# Altium schematic symbol library BARKO_SCHLIB.SchLib: 1064 symbols (part 2 of 11) (continued)
## CON-2X2-4.2MM-V (continued)
CONN HEADER VERT 4POS 4.2MM; Manufacturer: Molex; Max Voltage Rating (DC): 600.6kV; Voltage Rating: 600V; Current Rating: 9A; Mating Cycles: 30; Gender: Male; Contact Resistance: 10mR; Max Current Rating: 8A; Number of Positions: 4; Connector Type: Rectangular; Insulation Resistance: 1GR; Row Spacing: 5.5mm; Approvals: UL,CSA,TUV; Glow Wire Compliant: Non-compliant; Washability: OK; .Creator: M.OZKAN; .PCBCHK: USED; Supplier 1: Digi-Key; Manufacturer Part Number: 39-28-8040; Stock 1: 2184; Pricing 1: 1=1,05000, 10=0,92000, 100=0,79330, 500=0,64908, 1000=0,57696, 5000=0,50484, 10000=0,47960 (USD); RoHS: Yes; Mount: Through Hole; Contact Plating: Tin,Copper,Bright; Contact Material: Brass; Color: Natural; Material: Nylon; Housing Color: Natural; Housing Material: Nylon; Min Operating Temperature: -40°C; Max Operating Temperature: 105°C; Number of Rows: 2; Voltage Rating (AC): 600V; Contact Gender: Male; Packaging: Bulk; Package Quantity: 700; Termination: Solder; Number of Contacts: 4; Max Voltage Rating (AC): 600V; Orientation: Straight; Number of Circuits: 4; Voltage Rating (DC): 600V; Length: 10mm; Height: 12.8mm; Lead Pitch: 4.2mm; Width: 12.8mm; Pitch: 4.2mm; Depth: 11mm; Radiation Hardening: No; REACH SVHC: Unknown; Halogen Free: Low Halogen; Lead Free: Lead Free; Flammability Rating: UL94 V-0; ComponentLink1URL: https://datasheet.ciiva.com/7843/1596928-7843938.pdf?src-supplier=Element14; ComponentLink1Description: https://datasheet.ciiva.com/7843/1596928-7843938.pdf?src-supplier=Element14; ComponentLink2URL: https://datasheet.ciiva.com/22683/1722365-22683427.pdf?src-supplier=Element14; ComponentLink2Description: https://datasheet.ciiva.com/22683/1722365-22683427.pdf?src-supplier=Element14; ComponentLink3URL: https://datasheet.ciiva.com/16654/0039288040-pcb-headers-16654999.pdf?src-supplier=Avnet+Europe; ComponentLink3Description: https://datasheet.ciiva.com/16654/0039288040-pcb-headers-16654999.pdf?src-supplier=Avnet+Europe; ComponentLink4URL: https://datasheet.ciiva.com/5147/0039288040-pcb-headers-228424-5147723.pdf?src-supplier=Mouser; ComponentLink4Description: https://datasheet.ciiva.com/5147/0039288040-pcb-headers-228424-5147723.pdf?src-supplier=Mouser; ComponentLink5URL: https://datasheet.ciiva.com/11746/0900766b80d882e8-11746219.pdf?src-supplier=RSComponents; ComponentLink5Description: https://datasheet.ciiva.com/11746/0900766b80d882e8-11746219.pdf?src-supplier=RSComponents; ComponentLink6URL: https://datasheet.ciiva.com/30131/73420039288040-pcb-headers-30131996.pdf?src-supplier=Onlinecomponents.com; ComponentLink6Description: https://datasheet.ciiva.com/30131/73420039288040-pcb-headers-30131996.pdf?src-supplier=Onlinecomponents.com; ComponentLink7URL: https://datasheet.ciiva.com/19461/881346-19461679.pdf?src-supplier=Jameco; ComponentLink7Description: https://datasheet.ciiva.com/19461/881346-19461679.pdf?src-supplier=Jameco; ComponentLink8URL: https://datasheet.ciiva.com/26916/getdatasheetpartid-149656-26916395.pdf?src-supplier=Verical; ComponentLink8Description: https://datasheet.ciiva.com/26916/getdatasheetpartid-149656-26916395.pdf?src-supplier=Verical; Supplier Part Number 1: WM23801-ND; .SCHCHK: USED
pins: 1, 2, 3, 4

## CON-2X3-PROGRAMLAYICI
designator J?  (value not drawn)
.PCBCHK: USED; .Creator: F:TALI; Washability: OK; .SCHCHK: USED
footprint P-TC2030-IDC
pins: 1, 2, 3, 4, 5, 6

## CON-2X3X1.27-PROGRAMLAYICI
designator J?  (value not drawn)
CONN HEADER SMD 6POS 1.27MM; Manufacturer Part Number: FTSH-103-01-L-DV; .PCBCHK: USED; .Creator: M.OZKAN; Washability: OK; .SCHCHK: USED
footprint P-2X3X1.27-HEADER
pins: 1, 2, 3, 4, 5, 6

## CON-2X5-4.2MM
designator J?, comment L-KLS1-4.20-2X05-S
CONN HEADER VERT 10POS 4.2MM; Manufacturer: Molex; Gender: Male; Current Rating: 7A; Number of Poles: 10; Voltage Rating (AC): 600V; Max Current Rating: 3A; Max Voltage Rating (DC): 600.6kV; Connector Type: Power,Rectangular; Working Voltage: 250V; Insulation Resistance: 1GR; Approvals: UL,CSA,TUV; Glow Wire Compliant: Non-compliant; Washability: OK; .Creator: M.OZKAN; .PCBCHK: USED; Supplier 1: Digi-Key; Manufacturer Part Number: 39-28-1103; Stock 1: 2431; Pricing 1: 1=1,39000, 10=1,26000, 100=1,07960, 500=0,89968, 1000=0,77115, 5000=0,68375, 10000=0,66833 (USD); RoHS: Yes; Mount: Through Hole; Contact Plating: Tin,Gold; Contact Material: Brass,Bronze; Color: Natural,Clear; Housing Color: Black; Housing Material: Nylon; Min Operating Temperature: -65°C; Max Operating Temperature: 105°C; Packaging: Bulk; Number of Rows: 2; Voltage Rating: 600V; Package Quantity: 250; Contact Gender: Male; Number of Positions: 10; Termination: Solder; Number of Contacts: 10; Orientation: Straight; Voltage Rating (DC): 600V; Number of Circuits: 10; Length: 101.19mm; Height: 3.5mm; Lead Pitch: 4.2mm; Pitch: 4.2mm; Row Spacing: 4.2mm; Depth: 9.39mm; Radiation Hardening: No; Halogen Free: Low Halogen; Lead Free: Lead Free; Flammability Rating: UL94 V-2; ComponentLink1URL: https://datasheet.ciiva.com/19462/1968785-19462082.pdf?src-supplier=Jameco; ComponentLink1Description: https://datasheet.ciiva.com/19462/1968785-19462082.pdf?src-supplier=Jameco; ComponentLink2URL: https://datasheet.ciiva.com/5150/0039281103-pcb-headers-159999-5150355.pdf?src-supplier=Mouser; ComponentLink2Description: https://datasheet.ciiva.com/5150/0039281103-pcb-headers-159999-5150355.pdf?src-supplier=Mouser; ComponentLink3URL: https://datasheet.ciiva.com/20209/22-3810e-20209539.pdf?src-supplier=Rapid+Electronics; ComponentLink3Description: https://datasheet.ciiva.com/20209/22-3810e-20209539.pdf?src-supplier=Rapid+Electronics; ComponentLink4URL: https://datasheet.ciiva.com/11746/0900766b80460da7-11746923.pdf?src-supplier=RSComponents; ComponentLink4Description: https://datasheet.ciiva.com/11746/0900766b80460da7-11746923.pdf?src-supplier=RSComponents; ComponentLink5URL: https://datasheet.ciiva.com/1442/1786428-1442785.pdf?src-supplier=Element14; ComponentLink5Description: https://datasheet.ciiva.com/1442/1786428-1442785.pdf?src-supplier=Element14; ComponentLink6URL: https://datasheet.ciiva.com/18453/70190699-18453847.pdf?src-supplier=Allied+Electronics; ComponentLink6Description: https://datasheet.ciiva.com/18453/70190699-18453847.pdf?src-supplier=Allied+Electronics; Supplier Part Number 1: WM3804-ND; .SCHCHK: USED
footprint CON-2X5-4.2MM-TH
pins: 1, 2, 3, 4, 5, 6, 7, 8, 9, 10

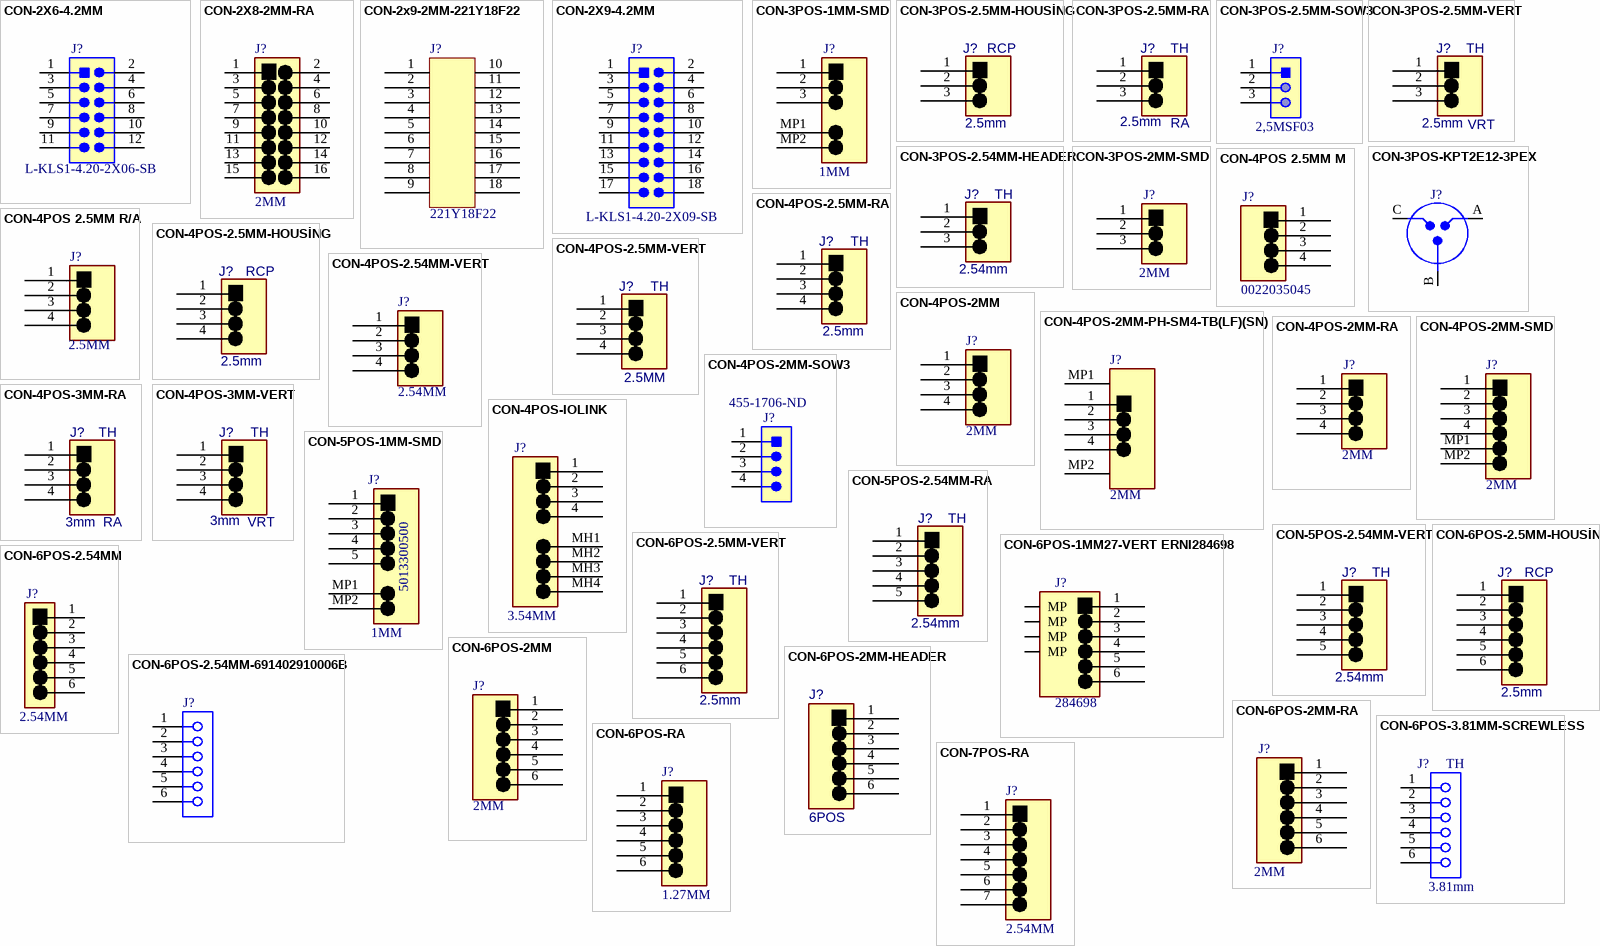
[diagram p5: symbols CON-2X6-4.2MM to CON-7POS-RA]

## CON-2X6-4.2MM
designator J?, comment L-KLS1-4.20-2X06-SB
CONN HEADER VERT 12POS 4.2MM; Manufacturer: Molex; Current Rating: 9A; Voltage Rating: 600V; Max Voltage Rating (DC): 600.6kV; Contact Resistance: 10mR; Max Current Rating: 6A; Number of Positions: 12; Gender: Female; Contact Post Length: 3.5mm; Glow Wire Compliant: Non-compliant; Washability: OK; .Creator: M.OZKAN; .PCBCHK: USED; Supplier 1: Digi-Key; Manufacturer Part Number: 39-29-3126; Stock 1: 1794; Pricing 1: 1=1,74000, 10=1,57700, 100=1,35140, 500=1,12612, 1000=0,96525, 5000=0,85586, 10000=0,83655 (USD); RoHS: Yes; Mount: Through Hole; Contact Material: Brass; Contact Plating: Tin,Copper; Housing Color: Natural; Color: Natural; Housing Material: Nylon; Min Operating Temperature: -40°C; Max Operating Temperature: 105°C; Package Quantity: 225; Number of Rows: 2; Packaging: Bulk; Contact Gender: Male; Termination: Solder; Number of Contacts: 12; Orientation: Straight; Number of Circuits: 12; Height: 12.8mm; Pitch: 4.2mm; Row Spacing: 4.2mm; Radiation Hardening: No; Halogen Free: Low Halogen; ComponentLink1URL: https://datasheet.ciiva.com/30119/70260039293126-pcb-headers-30119121.pdf?src-supplier=Onlinecomponents.com; ComponentLink1Description: https://datasheet.ciiva.com/30119/70260039293126-pcb-headers-30119121.pdf?src-supplier=Onlinecomponents.com; ComponentLink2URL: https://datasheet.ciiva.com/16654/0039293126-pcb-headers-16654565.pdf?src-supplier=Avnet+Europe; ComponentLink2Description: https://datasheet.ciiva.com/16654/0039293126-pcb-headers-16654565.pdf?src-supplier=Avnet+Europe; ComponentLink3URL: https://datasheet.ciiva.com/5150/0039293126-pcb-headers-140105-5150183.pdf?src-supplier=Mouser; ComponentLink3Description: https://datasheet.ciiva.com/5150/0039293126-pcb-headers-140105-5150183.pdf?src-supplier=Mouser; ComponentLink4URL: https://datasheet.ciiva.com/19461/1299462-19461278.pdf?src-supplier=Jameco; ComponentLink4Description: https://datasheet.ciiva.com/19461/1299462-19461278.pdf?src-supplier=Jameco; ComponentLink5URL: https://datasheet.ciiva.com/1403/1596536-1403542.pdf?src-supplier=Element14; ComponentLink5Description: https://datasheet.ciiva.com/1403/1596536-1403542.pdf?src-supplier=Element14; Supplier Part Number 1: WM3848-ND; .SCHCHK: USED
footprint CON-2X6-4.2MM-TH
pins: 1, 2, 3, 4, 5, 6, 7, 8, 9, 10, 11, 12

## CON-2X8-2MM-RA
designator J?, comment 2MM
CONN HEADER 2X8 POS 2MM R/A; Washability: OK; .Creator: M.OZKAN; .PCBCHK: USED; .SCHCHK: USED
footprint CON-2X8-2MM-RA
pins: 1, 2, 3, 4, 5, 6, 7, 8, 9, 10, 11, 12, 13, 14, 15, 16

## CON-2x9-2MM-221Y18F22
designator J?, comment 221Y18F22
CONN MALE 2X9 POS 2MM PCB Straight.; Manufacturer: nicomatic; .Creator: HKARA; Washability: OK; .PCBCHK: *; .SCHCHK: *; Manufacturer Part Number: 221Y18F22
footprint CON-16POS-2MM-221Y18F22 (Nicomatic 221Y18F22)
pins: 1, 2, 3, 4, 5, 6, 7, 8, 9, 10, 11, 12, 13, 14, 15, 16, 17, 18

## CON-2X9-4.2MM
designator J?, comment L-KLS1-4.20-2X09-SB
CONN HEADER VERT 18POS 4.2MM; Manufacturer: Molex; Contact Resistance: 10mR; Number of Positions: 18; Number of Ports: 1; Max Voltage Rating (AC): 600V; Gender: Male; Connector Type: Male Pin; Row Spacing: 0.165inch; Washability: OK; .Creator: M.OZKAN; .PCBCHK: USED; Supplier 1: Digi-Key; Manufacturer Part Number: 39-28-1183; Stock 1: 102; Pricing 1: 1=2,61000, 10=2,50400, 100=2,08680, 500=1,77378, 1000=1,51293, 5000=1,35642 (USD); RoHS: Yes; Mount: Through Hole; Contact Material: Brass; Contact Plating: Tin,Copper,Bright; Color: Natural; Number of Terminals: 18; Housing Color: Natural; Housing Material: Nylon; Min Operating Temperature: -40°C; Max Operating Temperature: 105°C; Packaging: Tray; Number of Rows: 2; Fastening Type: Ramp; Termination: Solder; Number of Contacts: 18; Max Voltage Rating (DC): 600V; Orientation: Straight; Length: 39.8mm; Pitch: 4.2mm; Depth: 11mm; ComponentLink1URL: https://datasheet.ciiva.com/11748/0900766b80c67620-11748530.pdf?src-supplier=RSComponents; ComponentLink1Description: https://datasheet.ciiva.com/11748/0900766b80c67620-11748530.pdf?src-supplier=RSComponents; ComponentLink2URL: https://datasheet.ciiva.com/30232/3980039281183-pcb-headers-30232211.pdf?src-supplier=Onlinecomponents.com; ComponentLink2Description: https://datasheet.ciiva.com/30232/3980039281183-pcb-headers-30232211.pdf?src-supplier=Onlinecomponents.com; ComponentLink3URL: https://datasheet.ciiva.com/26916/getdatasheetpartid-292510-26916571.pdf?src-supplier=Verical; ComponentLink3Description: https://datasheet.ciiva.com/26916/getdatasheetpartid-292510-26916571.pdf?src-supplier=Verical; ComponentLink4URL: https://datasheet.ciiva.com/27055/1968822-27055405.pdf?src-supplier=Jameco; ComponentLink4Description: https://datasheet.ciiva.com/27055/1968822-27055405.pdf?src-supplier=Jameco; ComponentLink5URL: https://datasheet.ciiva.com/18486/039281183-sd-18486411.pdf?src-supplier=Digi-Key; ComponentLink5Description: https://datasheet.ciiva.com/18486/039281183-sd-18486411.pdf?src-supplier=Digi-Key; ComponentLink6URL: https://datasheet.ciiva.com/49273/303925-49273802.pdf?src-supplier=Jameco; ComponentLink6Description: https://datasheet.ciiva.com/49273/303925-49273802.pdf?src-supplier=Jameco; Supplier Part Number 1: WM3808-ND; .SCHCHK: USED
footprint CON-2X9-4.2MM-TH
pins: 1, 2, 3, 4, 5, 6, 7, 8, 9, 10, 11, 12, 13, 14, 15, 16, 17, 18

## CON-3POS-1MM-SMD
designator J?, comment 1MM
CONN HEADER 1MM 3POS SMD TIN; Manufacturer: Molex; Manufacturer Part Number: 501331-0307; Number of Contacts: 3; Voltage Rating: 50V; Current Rating: 1A; Gender: Male; Connector Type: Male Pin; Contact Resistance: 20mR; Max Voltage Rating (DC): 5.05kV; Glow Wire Compliant: Non-compliant; Washability: OK; .Creator: M.OZKAN; .PCBCHK: USED; Supplier 1: Digi-Key; Supplier Part Number 1: WM7880CT-ND; Stock 1: 4520; Pricing 1: 1=0.62000, 10=0.58400, 100=0.44780, 500=0.38940 (USD); RoHS: Yes; Mount: Surface Mount; Contact Plating: Tin; Contact Material: Bronze,Tin; Color: Natural; Housing Color: Natural; Housing Material: Nylon; Min Operating Temperature: -40°C; Max Operating Temperature: 85°C; Number of Rows: 1; Termination: Solder; Packaging: Tape and Reel; Fastening Type: Detent; Number of Positions: 3; Max Voltage Rating (AC): 50V; Orientation: Vertical; Package Quantity: 1; Contact Gender: Male; Number of Circuits: 3; Length: 5.24mm; Pitch: 1mm; Depth: 3.5mm; Radiation Hardening: No; REACH SVHC: Unknown; Lead Free: Lead Free; ComponentLink1URL: https://datasheet.ciiva.com/724/5013310207-sd-724391.pdf?src-supplier=Digi-Key; ComponentLink1Description: https://datasheet.ciiva.com/724/5013310207-sd-724391.pdf?src-supplier=Digi-Key; ComponentLink2URL: https://datasheet.ciiva.com/5155/5013310307-pcb-headers-179250-5155744.pdf?src-supplier=Mouser; ComponentLink2Description: https://datasheet.ciiva.com/5155/5013310307-pcb-headers-179250-5155744.pdf?src-supplier=Mouser; ComponentLink3URL: https://datasheet.ciiva.com/9469/5013310307-pcb-headers-9469056.pdf?src-supplier=Avnet; ComponentLink3Description: https://datasheet.ciiva.com/9469/5013310307-pcb-headers-9469056.pdf?src-supplier=Avnet; ComponentLink4URL: https://datasheet.ciiva.com/30175/3755013310307-pcb-headers-30175520.pdf?src-supplier=Onlinecomponents.com; ComponentLink4Description: https://datasheet.ciiva.com/30175/3755013310307-pcb-headers-30175520.pdf?src-supplier=Onlinecomponents.com; ComponentLink5URL: https://datasheet.ciiva.com/14804/263235013310307-pcb-headers-14804423.pdf?src-supplier=Arrow; ComponentLink5Description: https://datasheet.ciiva.com/14804/263235013310307-pcb-headers-14804423.pdf?src-supplier=Arrow; ComponentLink6URL: https://datasheet.ciiva.com/11750/0900766b80b0af91-11750733.pdf?src-supplier=RSComponents; ComponentLink6Description: https://datasheet.ciiva.com/11750/0900766b80b0af91-11750733.pdf?src-supplier=RSComponents; ComponentLink7URL: https://datasheet.ciiva.com/16656/5013310307-pcb-headers-16656427.pdf?src-supplier=Avnet+Europe; ComponentLink7Description: https://datasheet.ciiva.com/16656/5013310307-pcb-headers-16656427.pdf?src-supplier=Avnet+Europe; ComponentLink8URL: https://datasheet.ciiva.com/724/5013310307-sd-724428.pdf?src-supplier=Digi-Key; ComponentLink8Description: https://datasheet.ciiva.com/724/5013310307-sd-724428.pdf?src-supplier=Digi-Key; ComponentLink9URL: https://datasheet.ciiva.com/9469/5013310307-pcb-headers-9469053.pdf?src-supplier=Avnet; ComponentLink9Description: https://datasheet.ciiva.com/9469/5013310307-pcb-headers-9469053.pdf?src-supplier=Avnet; ComponentLink10URL: https://datasheet.ciiva.com/727/5013310307-sd-727119.pdf?src-supplier=Digi-Key; ComponentLink10Description: https://datasheet.ciiva.com/727/5013310307-sd-727119.pdf?src-supplier=Digi-Key; .SCHCHK: USED
footprint CON-3POS-1MM-SMD
pins: 1, 2, 3, MP1, MP2

## CON-3POS-2.5MM-HOUSİNG
designator J?  Connector Type: RCP  Pitch: 2.5mm  (hidden comment: *)
CONN HOUSING 3POS 2.5MM SHROUD; Manufacturer: Molex; Manufacturer Part Number: 0050375033; Number of Positions: 3; Gender: Female; .PCBCHK: USED; .Creator: F:TALI; Washability: OK; Supplier 1: Digi-Key; Stock 1: 10973; Pricing 1: 1=0.36, 10=0.337, 25=0.2888, 50=0.2454, 100=0.2357, 250=0.21164, 500=0.20202, 1000=0.16835, 2500=0.15392 (USD); Mount: Free Hanging; Housing Material: Nylon; Min Operating Temperature: -40°C; Max Operating Temperature: 105°C; Number of Rows: 1; Packaging: Bulk; Termination: Crimp; Number of Contacts: 3; Orientation: Straight; Fastening Type: Ramp; Length: 9.9mm; Depth: 9mm; Radiation Hardening: No; ComponentLink1URL: https://www.molex.com/pdm_docs/sd/050375033_sd.pdf; ComponentLink1Description: https://www.molex.com/pdm_docs/sd/050375033_sd.pdf; ComponentLink2URL: http://www.molex.com/webdocs/datasheets/pdf/en-us/0050375033_CRIMP_HOUSINGS.pdf; ComponentLink2Description: http://www.molex.com/webdocs/datasheets/pdf/en-us/0050375033_CRIMP_HOUSINGS.pdf; ComponentLink3URL: https://www.verical.com/server-webapp/html/getDatasheet?partID=173295; ComponentLink3Description: https://www.verical.com/server-webapp/html/getDatasheet?partID=173295; Supplier Part Number 1: WM18874-ND; .SCHCHK: USED
pins: 1 GND_IN, 2, 3

## CON-3POS-2.5MM-RA
designator J?  Mount: TH  Orientation: RA  Pitch: 2.5mm  (hidden comment: *)
CONN HEADER 3POS 2.5MM R/A TIN; Manufacturer: Molex; Manufacturer Part Number: 0022057035; Gender: Male; Contact Resistance: 20mR; Number of Positions: 3; Max Voltage Rating (DC): 250V; Connector Type: Male Pin; .PCBCHK: USED; .Creator: F:TALI; Washability: OK; Supplier 1: Digi-Key; Stock 1: 10713; Pricing 1: 1=0.56, 10=0.527, 100=0.4037, 500=0.351, 1000=0.28958, 5000=0.25448, 10000=0.23693 (USD); Colour: Natural; Contact Plating: Copper,Tin; Contact Material: Brass; Housing Colour: Natural; Housing Material: Nylon; Min Operating Temperature: -40°C; Max Operating Temperature: 105°C; Packaging: Bulk; Number of Rows: 1; Termination: Solder; Number of Contacts: 3; Max Voltage Rating (AC): 250V; Length: 9.9mm; Depth: 7.9mm; Contact Mating Length: 0.138inch; ComponentLink1URL: http://www.molex.com/webdocs/datasheets/pdf/en-us/0022057035_PCB_HEADERS.pdf; ComponentLink1Description: http://www.molex.com/webdocs/datasheets/pdf/en-us/0022057035_PCB_HEADERS.pdf; ComponentLink2URL: https://www.molex.com/pdm_docs/sd/022057035_sd.pdf; ComponentLink2Description: https://www.molex.com/pdm_docs/sd/022057035_sd.pdf; Supplier Part Number 1: WM18901-ND; .SCHCHK: USED
pins: 1 GND_IN, 2, 3

## CON-3POS-2.5MM-SOW3
designator J?, comment 2,5MSF03
Lumberg 2.5 MSF Series, 2.5mm Pitch 3 Way 1 Row Straight PCB Header, Solder Termination, 5A; Voltage Rating: 160V; Number of Contacts: 3; Gender: Male; Pitch: 5mm; Washability: OK; .Creator: M.OZKAN; .PCBCHK: USED; Supplier 1: TME; Manufacturer: Lumberg; Manufacturer Part Number: 2,5MSF03; Stock 1: 554; Pricing 1: 3=0.25440, 25=0.17800, 100=0.15820, 250=0.13850 (USD); RoHS: Yes; Case/Package: Module; Contact Material: Brass,CuZn; Contact Plating: Tin; Color: Black; Housing Material: Polyamide; Min Operating Temperature: -40°C; Max Operating Temperature: 120°C; Number of Rows: 1; Current Rating: 5A; Packaging: Bulk; Max Current Rating: 5A; Termination: Solder; Max Voltage Rating (AC): 160V; Orientation: Straight; Length: 12.2mm; Height: 22.5mm; Width: 7.5mm; Depth: 7.5mm; ComponentLink1URL: https://datasheet.ciiva.com/11754/0900766b80fbfb97-11754066.pdf?src-supplier=RSComponents; ComponentLink1Description: https://datasheet.ciiva.com/11754/0900766b80fbfb97-11754066.pdf?src-supplier=RSComponents; ComponentLink2URL: https://datasheet.ciiva.com/29195/732809-da-01-ml-stiftleiste-2-5-msf03-de-en-fr-29195855.pdf?src-supplier=Conrad; ComponentLink2Description: https://datasheet.ciiva.com/29195/732809-da-01-ml-stiftleiste-2-5-msf03-de-en-fr-29195855.pdf?src-supplier=Conrad; Supplier Part Number 1: 2.5MSF03; .SCHCHK: USED
footprint 2.5 MSF 03
pins: 1, 2, 3

## CON-3POS-2.5MM-VERT
designator J?  Orientation: VRT  Mount: TH  Pitch: 2.5mm  (hidden comment: *)
CONN HEADER 3POS 2.5MM VERT TIN; Manufacturer: Molex; Number of Contacts: 3; Gender: Male; Current Rating: 3A; Contact Resistance: 20mR; Insulation Resistance: 1GR; Voltage Rating: 250V; Shrouded: Yes (With); Test Voltage: 1kV; Glow Wire Compliant: Non-compliant; .PCBCHK: USED; .Creator: F:TALI; Washability: OK; Supplier 1: Digi-Key; Manufacturer Part Number: 22-03-5035; Stock 1: 24555; Pricing 1: 1=0.53, 10=0.497, 100=0.3811, 500=0.3314, 1000=0.27341, 5000=0.24027, 10000=0.2237 (USD); Contact Plating: Copper,Tin; Contact Material: Brass,Tin; Housing Material: Nylon; Min Operating Temperature: -40°C; Max Operating Temperature: 105°C; Number of Rows: 1; Packaging: Bulk; Termination: Solder; Number of Positions: 3; Voltage Rating (AC): 250V; Number of Poles: 3; Package Quantity: 25000; Contact Gender: Male; Working Voltage: 250V; Voltage Rating (DC): 250V; Number of Circuits: 3; Radiation Hardening: No; Lead Free: Lead Free; REACH SVHC: Unknown; Flammability Rating: UL94 V-0; ComponentLink1URL: http://uk.rs-online.com/webdocs/13c2/0900766b813c2d9b.pdf; ComponentLink1Description: http://uk.rs-online.com/webdocs/13c2/0900766b813c2d9b.pdf; ComponentLink2URL: http://www.farnell.com/datasheets/1762354.pdf; ComponentLink2Description: http://www.farnell.com/datasheets/1762354.pdf; ComponentLink3URL: http://www.mouser.com/ds/2/276/0022035035_PCB_HEADERS-158316.pdf; ComponentLink3Description: http://www.mouser.com/ds/2/276/0022035035_PCB_HEADERS-158316.pdf; Supplier Part Number 1: WM18887-ND; .SCHCHK: USED
footprint CON-3POS 2.5MM VERT
pins: 1 GND_IN, 2, 3

## CON-3POS-2.54MM-HEADER
designator J?  Pitch: 2.54mm  Mount: TH  (hidden comment: *)
CONN HEADER 3POS 2.54MM; Manufacturer: Wurth Electronics; Manufacturer Part Number: 61300311121; Number of Positions: 3; Gender: Male; Connector Type: Male Pin; .PCBCHK: USED; .Creator: F:TALI; Washability: OK; Supplier 1: Digi-Key; Stock 1: 178007; Pricing 1: 1=0.13, 10=0.106, 25=0.088, 50=0.074, 100=0.067, 1000=0.061 (USD); Contact Plating: Gold; Contact Material: Copper; Colour: Black; Number of Rows: 1; Packaging: Bulk; Termination: Solder; Number of Contacts: 3; Contact Mating Length: 0.236inch; REACH SVHC: Unknown; Lead Free: Lead Free; Supplier Part Number 1: 732-5316-ND; .SCHCHK: USED
pins: 1 GND_IN, 2, 3

## CON-3POS-2MM-SMD
designator J?, comment 2MM
CONN HEADER SMD 3POS 2MM; Manufacturer: JST; Manufacturer Part Number: B3B-PH-SM4-TB(LF)(SN); Number of Positions: 3; Connector Type: Male Pin; Contact Resistance: 20mR; Current Rating: 2A; Voltage Rating (AC): 100V; Insulation Resistance: 1GR; Gender: Male; Washability: OK; .Creator: M.OZKAN; .PCBCHK: USED; Supplier 1: Digi-Key; Supplier Part Number 1: 455-1735-2-ND; Stock 1: 36000; Pricing 1: 1000=0.29721, 2000=0.28821, 3000=0.27019, 5000=0.26118, 10000=0.24317, 25000=0.23417 (USD); RoHS: Yes; Mount: Surface Mount; Color: Natural,White; Contact Plating: Tin,Copper; Contact Material: Copper Alloy,Tin,Bronze,Brass; Housing Color: Beige; Housing Material: Polyamide; Min Operating Temperature: -25°C; Max Operating Temperature: 85°C; Number of Rows: 1; Packaging: Tape and Reel; Termination: Solder; Max Current Rating: 2A; Number of Poles: 3; Voltage Rating: 100V; Fastening Type: Detent; Max Voltage Rating (AC): 100V; Number of Contacts: 3; Max Voltage Rating (DC): 100V; Working Voltage: 100V; Orientation: Straight; Length: 9.95mm; Height: 9.4mm; Pitch: 2mm; Lead Pitch: 2mm; Width: 5.5mm; Contact Mating Length: 0.13inch; Depth: 5mm; Lead Free: Lead Free; REACH SVHC: No SVHC; Flammability Rating: UL94 V-0; ComponentLink1URL: https://datasheet.ciiva.com/11747/0900766b80ddea81-11747684.pdf?src-supplier=RSComponents; ComponentLink1Description: https://datasheet.ciiva.com/11747/0900766b80ddea81-11747684.pdf?src-supplier=RSComponents; .SCHCHK: USED
footprint CON-3POS-2MM-SMD
pins: 1 GND_IN, 2, 3

## CON-3POS-KPT2E12-3PEX
designator J?  (value not drawn)
Washability: OK; .Creator: M.OZKAN; .PCBCHK: USED; .SCHCHK: USED
footprint CON-3POS-KPT2E12-3PEX
pins: A, B, C

## CON-4POS 2.5MM M
designator J?, comment 0022035045
CONN HEADER VERT 4POS 2.5MM; Manufacturer: Molex; Number of Positions: 4; Gender: Male; Current Rating: 3A; Voltage Rating: 250V; Contact Resistance: 20mR; Insulation Resistance: 1GR; Test Voltage: 1kV; Washability: OK; .Creator: M.OZKAN; .PCBCHK: USED; Supplier 1: Digi-Key; Manufacturer Part Number: 22-03-5045; Stock 1: 28354; Pricing 1: 1=0,66000, 10=0,61400, 100=0,47100, 500=0,40960, 1000=0,33792, 5000=0,29696, 10000=0,27648 (USD); RoHS: Yes; Mount: Through Hole; Housing Material: Nylon; Contact Plating: Tin; Contact Material: Brass; Material: Nylon; Min Operating Temperature: -40°C; Max Operating Temperature: 105°C; Packaging: Bulk; Termination: Through Hole; Number of Rows: 1; Number of Contacts: 4; Package Quantity: 12000; Orientation: Straight; Contact Gender: Male; Number of Poles: 4; Voltage Rating (DC): 250V; Pitch: 2.5mm; Radiation Hardening: No; Lead Free: Lead Free; REACH SVHC: Unknown; Flammability Rating: UL94 V-0; ComponentLink1URL: https://datasheet.ciiva.com/30140/59000022035045-pcb-headers-30140706.pdf?src-supplier=Onlinecomponents.com; ComponentLink1Description: https://datasheet.ciiva.com/30140/59000022035045-pcb-headers-30140706.pdf?src-supplier=Onlinecomponents.com; ComponentLink2URL: https://datasheet.ciiva.com/11746/0900766b80da772c-11746677.pdf?src-supplier=RSComponents; ComponentLink2Description: https://datasheet.ciiva.com/11746/0900766b80da772c-11746677.pdf?src-supplier=RSComponents; ComponentLink3URL: https://datasheet.ciiva.com/5157/0022035045-pcb-headers-132183-5157848.pdf?src-supplier=Mouser; ComponentLink3Description: https://datasheet.ciiva.com/5157/0022035045-pcb-headers-132183-5157848.pdf?src-supplier=Mouser; ComponentLink4URL: https://datasheet.ciiva.com/27054/1930699-27054941.pdf?src-supplier=Jameco; ComponentLink4Description: https://datasheet.ciiva.com/27054/1930699-27054941.pdf?src-supplier=Jameco; ComponentLink5URL: https://datasheet.ciiva.com/25908/0022035045-pcb-headers-25908182.pdf?src-supplier=Avnet+Europe; ComponentLink5Description: https://datasheet.ciiva.com/25908/0022035045-pcb-headers-25908182.pdf?src-supplier=Avnet+Europe; ComponentLink6URL: https://datasheet.ciiva.com/9468/0022035045-pcb-headers-9468375.pdf?src-supplier=Avnet; ComponentLink6Description: https://datasheet.ciiva.com/9468/0022035045-pcb-headers-9468375.pdf?src-supplier=Avnet; ComponentLink7URL: https://datasheet.ciiva.com/7843/1864671-7843917.pdf?src-supplier=Element14; ComponentLink7Description: https://datasheet.ciiva.com/7843/1864671-7843917.pdf?src-supplier=Element14; Supplier Part Number 1: WM18888-ND; .SCHCHK: USED
footprint CON-22035045
pins: 1 GND_IN, 2, 3, 4

## CON-4POS 2.5MM R/A
designator J?, comment 2.5MM
CONN HEADER R/A 4POS 2.5MM; Manufacturer 1: JST; Manufacturer Part Number 1: S4B-XH-A(LF)(SN); Current Rating: 3A; Voltage Rating: 250V; Contact Resistance: 20mR; Number of Positions: 4; Insulation Resistance: 1GR; Gender: Male; Connector Type: Male Pin; Wire/Cable Gauge: 22AWG; Washability: OK; .Creator: M.OZKAN; .PCBCHK: USED; Supplier 1: Digi-Key; Stock 1: 37754; Pricing 1: 1=0,27000, 10=0,25700, 100=0,17850, 500=0,15100, 1000=0,12355, 5000=0,10982, 10000=0,09953 (USD); RoHS: Yes; Mount: Through Hole; Color: Natural; Contact Material: Brass; Contact Plating: Tin; Housing Color: White; Housing Material: Polyamide; Min Operating Temperature: -25°C; Max Operating Temperature: 85°C; Package Quantity: 500; Number of Rows: 1; Packaging: Bulk; Voltage Rating (AC): 250V; Max Current Rating: 3A; Termination: Press-Fit; Number of Contacts: 4; Max Voltage Rating (AC): 250V; Orientation: Right Angle; Length: 12.4mm; Lead Pitch: 2.5mm; Pitch: 2.5mm; Depth: 11.5mm; REACH SVHC: No SVHC; Lead Free: Lead Free; ComponentLink1URL: https://datasheet.ciiva.com/726/exh-726400.pdf?src-supplier=Digi-Key; ComponentLink1Description: https://datasheet.ciiva.com/726/exh-726400.pdf?src-supplier=Digi-Key; ComponentLink2URL: https://datasheet.ciiva.com/26924/getdatasheetpartid-449045-26924078.pdf?src-supplier=Verical; ComponentLink2Description: https://datasheet.ciiva.com/26924/getdatasheetpartid-449045-26924078.pdf?src-supplier=Verical; ComponentLink3URL: https://datasheet.ciiva.com/8052/5448-8052236.pdf?src-supplier=Element14; ComponentLink3Description: https://datasheet.ciiva.com/8052/5448-8052236.pdf?src-supplier=Element14; Supplier Part Number 1: 455-2243-ND; .SCHCHK: USED
footprint CON-4POS-2.5MM-R/A (CONN HEADER R/A 4POS 2.5MM)
pins: 1 GND_IN, 2, 3, 4

## CON-4POS-2.5MM-HOUSİNG
designator J?  Gender: RCP  Pitch: 2.5mm  (hidden comment: *)
CONN HOUSING 4POS 2.5MM SHROUD; Manufacturer: Molex; Body Material: Nylon,Polyamide; Connector Type: Power,Rectangular; Number of Positions: 4; Current Rating: 3A; Voltage Rating (AC): 250V; Shrouded: Yes (With); Test Voltage: 1kV; Insulation Resistance: 1GR; Approvals: CSA,UL; Glow Wire Compliant: Non-compliant; .PCBCHK: USED; .Creator: F:TALI; Washability: OK; Supplier 1: Digi-Key; Manufacturer Part Number: 50-37-5043; Stock 1: 6605; Pricing 1: 1=0.42, 10=0.393, 25=0.3368, 50=0.2864, 100=0.2751, 250=0.24708, 500=0.23584, 1000=0.19653, 2500=0.17968 (USD); Mount: Cable,PCB; Housing Material: Polyamide; Material: Nylon,Polyamide; Min Operating Temperature: -40°C; Max Operating Temperature: 105°C; Number of Rows: 1; Packaging: Bulk; Termination: Crimp; Number of Contacts: 4; Orientation: Straight; Number of Poles: 4; Contact Gender: Female; Package Quantity: 4000; Working Voltage: 250V; Length: 12.4mm; Height: 8mm; Depth: 8mm; Width: 3.9mm; Radiation Hardening: No; REACH SVHC: Unknown; Lead Free: Lead Free; Halogen Free: Low Halogen; Flammability Rating: UL94 V-0; ComponentLink1URL: http://www.onlinecomponents.com/productFiles/mf-MOL/377140050375043_crimp_housings.pdf; ComponentLink1Description: http://www.onlinecomponents.com/productFiles/mf-MOL/377140050375043_crimp_housings.pdf; ComponentLink2URL: http://www.molex.com/webdocs/datasheets/pdf/en-us/0050375043_CRIMP_HOUSINGS.pdf; ComponentLink2Description: http://www.molex.com/webdocs/datasheets/pdf/en-us/0050375043_CRIMP_HOUSINGS.pdf; ComponentLink3URL: http://www.farnell.com/datasheets/2035857.pdf; ComponentLink3Description: http://www.farnell.com/datasheets/2035857.pdf; ComponentLink4URL: http://www.mouser.com/ds/2/276/0050375043_CRIMP_HOUSINGS-137285.pdf; ComponentLink4Description: http://www.mouser.com/ds/2/276/0050375043_CRIMP_HOUSINGS-137285.pdf; Supplier Part Number 1: WM17405-ND; .SCHCHK: USED
pins: 1 GND_IN, 2, 3, 4

## CON-4POS-2.5MM-RA
designator J?  Pitch: 2.5mm  Mount: TH  (hidden comment: *)
CONN HEADER 4POS 2.5MM R/A TIN; Manufacturer: Molex; Number of Contacts: 4; Current Rating: 3A; Contact Resistance: 20mR; Gender: Male; Insulation Resistance: 1GR; Connector Type: Male Pin; Voltage Rating: 250V; Max Voltage Rating (DC): 250.25kV; Shrouded: Yes (With); Test Voltage: 1kV; Glow Wire Compliant: Non-compliant; .PCBCHK: USED; .Creator: F:TALI; Washability: OK; Supplier 1: Digi-Key; Manufacturer Part Number: 22-05-7045; Stock 1: 9776; Pricing 1: 1=0.75, 10=0.66, 100=0.5698, 500=0.4662, 1000=0.4144, 5000=0.3626, 10000=0.34447 (USD); Contact Plating: Copper,Tin; Contact Material: Brass,Tin; Housing Material: Nylon; Housing Colour: Natural; Colour: Natural; Material: Nylon,Polyamide; Min Operating Temperature: -40°C; Max Operating Temperature: 105°C; Number of Rows: 1; Termination: Solder; Orientation: Right Angle; Packaging: Bulk; Package Quantity: 1; Number of Positions: 4; Voltage Rating (DC): 250V; Number of Circuits: 4; Contact Gender: Male; Number of Poles: 4; Voltage Rating (AC): 250V; Working Voltage: 250V; Lead Pitch: 2.5mm; Contact Mating Length: 0.138inch; Radiation Hardening: No; Lead Free: Lead Free; Flammability Rating: UL94 V-0; REACH SVHC: Unknown; ComponentLink1URL: http://uk.rs-online.com/webdocs/13c2/0900766b813c2df4.pdf; ComponentLink1Description: http://uk.rs-online.com/webdocs/13c2/0900766b813c2df4.pdf; ComponentLink2URL: http://www.farnell.com/datasheets/1626532.pdf; ComponentLink2Description: http://www.farnell.com/datasheets/1626532.pdf; ComponentLink3URL: http://www.mouser.com/ds/2/276/0022057045_PCB_HEADERS-158482.pdf; ComponentLink3Description: http://www.mouser.com/ds/2/276/0022057045_PCB_HEADERS-158482.pdf; ComponentLink4URL: http://www.molex.com/webdocs/datasheets/pdf/en-us/0022057045_PCB_HEADERS.pdf; ComponentLink4Description: http://www.molex.com/webdocs/datasheets/pdf/en-us/0022057045_PCB_HEADERS.pdf; ComponentLink5URL: https://www.molex.com/pdm_docs/sd/022057045_sd.pdf; ComponentLink5Description: https://www.molex.com/pdm_docs/sd/022057045_sd.pdf; Supplier Part Number 1: WM18902-ND; .SCHCHK: USED
pins: 1 GND_IN, 2, 3, 4

## CON-4POS-2.5MM-VERT
designator J?, comment 2.5MM  Mount: TH
CONN HEADER 4POS 2.5MM VERT TIN; Manufacturer: Molex; Contact Resistance: 20mR; Number of Positions: 4; Current Rating: 3A; Voltage Rating: 250V; Gender: Male; Insulation Resistance: 1GR; Test Voltage: 1kV; .PCBCHK: USED; .Creator: F:TALI; Washability: OK; Supplier 1: Digi-Key; Manufacturer Part Number: 22-03-5045; Stock 1: 15410; Pricing 1: 1=0.66, 10=0.614, 100=0.471, 500=0.4096, 1000=0.33792, 5000=0.29696, 10000=0.27648 (USD); Contact Plating: Copper,Tin; Contact Material: Brass,Tin; Housing Material: Nylon; Material: Nylon; Min Operating Temperature: -40°C; Max Operating Temperature: 105°C; Number of Rows: 1; Packaging: Bulk; Termination: Through Hole; Number of Contacts: 4; Orientation: Straight; Package Quantity: 12000; Number of Poles: 4; Voltage Rating (DC): 250V; Contact Gender: Male; Radiation Hardening: No; REACH SVHC: Unknown; Lead Free: Lead Free; Flammability Rating: UL94 V-0; ComponentLink1URL: http://uk.rs-online.com/webdocs/13c2/0900766b813c2d9c.pdf; ComponentLink1Description: http://uk.rs-online.com/webdocs/13c2/0900766b813c2d9c.pdf; ComponentLink2URL: http://www.molex.com/webdocs/datasheets/pdf/en-us/0022035045_PCB_HEADERS.pdf; ComponentLink2Description: http://www.molex.com/webdocs/datasheets/pdf/en-us/0022035045_PCB_HEADERS.pdf; ComponentLink3URL: http://www.mouser.com/ds/2/276/0022035045_PCB_HEADERS-132183.pdf; ComponentLink3Description: http://www.mouser.com/ds/2/276/0022035045_PCB_HEADERS-132183.pdf; ComponentLink4URL: http://www.farnell.com/datasheets/2035383.pdf; ComponentLink4Description: http://www.farnell.com/datasheets/2035383.pdf; ComponentLink5URL: http://www.jameco.com/Jameco/Products/ProdDS/1930699.pdf; ComponentLink5Description: http://www.jameco.com/Jameco/Products/ProdDS/1930699.pdf; Supplier Part Number 1: WM18888-ND; .SCHCHK: USED; Pitch: 2.5mm
footprint CON-4POS-2.5MM-VERT
pins: 1 GND_IN, 2, 3, 4

## CON-4POS-2.54MM-VERT
designator J?, comment 2.54MM
CONN HEADER VERT 4POS 2.5MM; Manufacturer Part Number: B4B-XH-A(LF)(SN); Manufacturer: JST; Current Rating: 3A; Contact Resistance: 20mR; Voltage Rating (AC): 250V; Number of Positions: 4; Insulation Resistance: 1GR; Connector Type: Male Pin; Gender: Male; Wire/Cable Gauge: 22AWG; .Creator: F:TALI; .PCBCHK: USED; Washability: OK; Supplier 1: Digi-Key; Supplier Part Number 1: 455-2249-ND; Stock 1: 216256; Pricing 1: 1=0.21, 10=0.194, 100=0.1348, 500=0.11406, 1000=0.09333, 5000=0.08296, 10000=0.07518 (USD); Mount: Through Hole; Contact Material: Brass; Contact Plating: Copper,Lead,Tin; Color: Natural; Housing Color: White; Housing Material: Polyamide; Material: Polyamide; Min Operating Temperature: -25°C; Max Operating Temperature: 85°C; Number of Rows: 1; Max Current Rating: 3A; Package Quantity: 500; Packaging: Bulk; Voltage Rating: 250V; Termination: Press-Fit; Max Voltage Rating (AC): 250V; Max Voltage Rating (DC): 250V; Number of Contacts: 4; Orientation: Straight; Length: 12.4mm; Pitch: 2.5mm; Lead Pitch: 2.5mm; Depth: 5.75mm; REACH SVHC: No SVHC; Lead Free: Lead Free; ComponentLink1URL: https://www.verical.com/server-webapp/html/getDatasheet?partID=455616&src-supplier=Verical; ComponentLink1Description: https://www.verical.com/server-webapp/html/getDatasheet?partID=455616&src-supplier=Verical; ComponentLink2URL: https://www.verical.com/server-webapp/html/getDatasheet?partID=640571&src-supplier=Verical; ComponentLink2Description: https://www.verical.com/server-webapp/html/getDatasheet?partID=640571&src-supplier=Verical; ComponentLink3URL: http://www.jst-mfg.com/product/pdf/eng/eXH.pdf?src-supplier=Digi-Key; ComponentLink3Description: http://www.jst-mfg.com/product/pdf/eng/eXH.pdf?src-supplier=Digi-Key; ComponentLink4URL: http://www.jst-mfg.com/product/pdf/eng/eXH.pdf?src-supplier=Future+Electronics; ComponentLink4Description: http://www.jst-mfg.com/product/pdf/eng/eXH.pdf?src-supplier=Future+Electronics; .SCHCHK: USED
footprint CON-4POS-2.54MM (2.54 mm (100mil))
pins: 1 GND_IN, 2, 3, 4

## CON-4POS-2MM
designator J?, comment 2MM